# Altium footprint library JL_PCB.PCBLIB: 1129 footprints (part 42 of 72)
Each footprint in its own frame and in the unit in brackets; x right, y up, seen from the top. Pads: shape width x height; smd on the part's side, far side on the other; paste and mask are expansions set on the pad; w line width, h text height; cw(c..) or ccw(c..) is an arc to the next point about the centre after c.
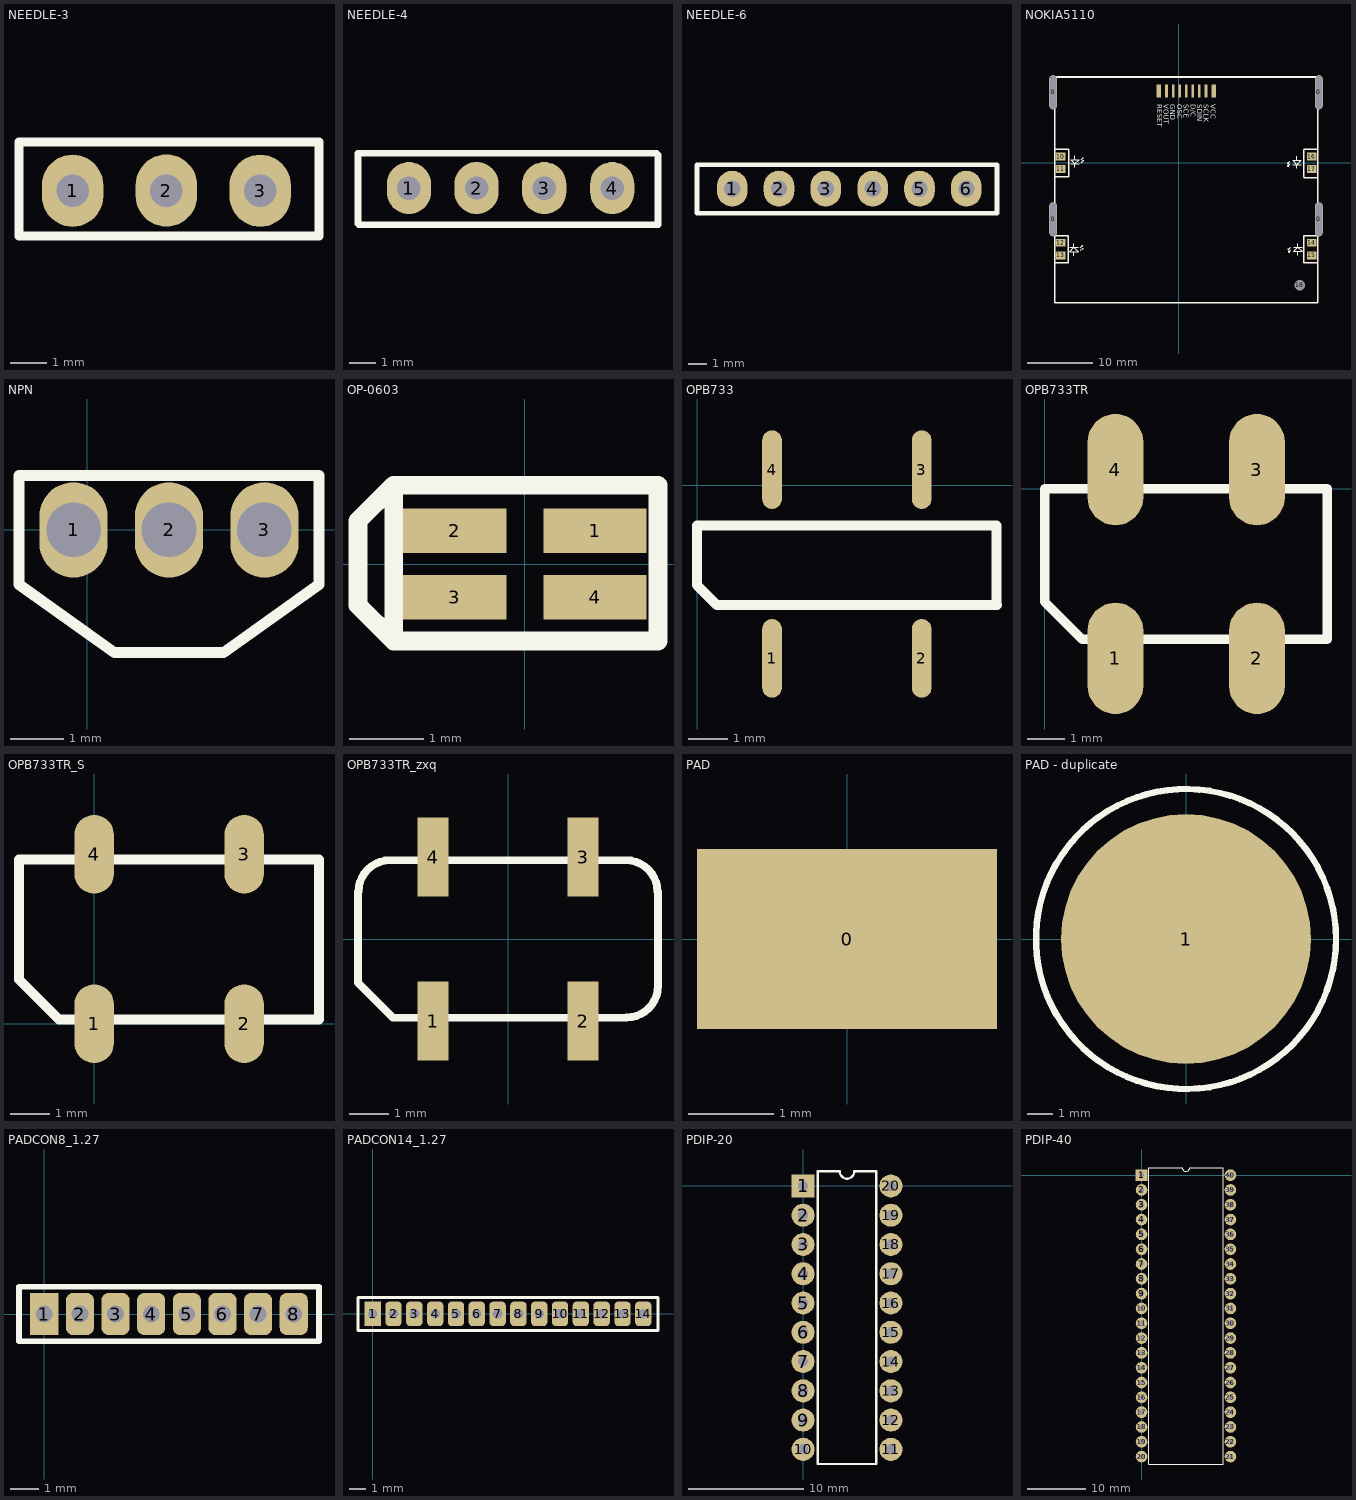
[diagram p41: the footprints below, top view; thin cyan lines are the x and y axes]

## NEEDLE-3 [mm]
pads (3):
  oval 1.7x2 hole 0.9: 1(297.583,114.754) 2(300.178,114.758) 3(302.773,114.754)
TopOverlay:
  lines w0.254: 296.1,113.5 296.1,116.1 304.4,116.1 304.4,113.5 296.1,113.5

## NEEDLE-4 [mm]
pads (4):
  oval 1.7x2 hole 0.9: 1(297.555,114.865) 2(300.15,114.869) 3(302.745,114.865) 4(305.355,114.865)
TopOverlay:
  lines w0.254: 295.6,113.5 295.6,116.2 307.056,116.2 307.111,116.144 307.111,113.462 ; 295.638,113.462 307.111,113.462 ; 307.073,113.5 307.111,113.462

## NEEDLE-6 [mm]
pads (6):
  oval 1.7x2 hole 0.9: 1(298.368,115.652) 2(300.963,115.656) 3(303.558,115.652) 4(306.168,115.652) 5(308.768,115.652) 6(311.368,115.652)
TopOverlay:
  lines w0.254: 296.413,114.287 313.068,114.287 313.068,116.987 296.413,116.987 296.413,114.287

## NOKIA5110 [mm]
pads (22):
  oval 1.2x5.2 hole 1 slot 5 at 90 deg: 0(-19.104,-8.636) 0(-19.104,10.668) 0(21.282,-8.636) 0(21.282,10.668)
  rect 0.7x2 smd: 1(5.276,10.882) 9(-3.024,10.882)
  rect 0.4x2 smd: 2(4.126,10.882) 3(3.126,10.882) 4(2.126,10.882) 5(1.126,10.882) 6(0.126,10.882) 7(-0.874,10.882) 8(-1.874,10.882)
  rect 1.5x1.2 smd: 10(-17.954,0.9) 11(-17.954,-1) 12(-17.954,-12.2) 13(-17.954,-14.1) 14(20.196,-12.2) 15(20.196,-14.1) 16(20.196,0.9) 17(20.196,-1)
  round 1.5 on Mech1 hole 1.6: 18(18.352,-18.63)
TopOverlay:
  lines w0.1: -14.948,-12.958 -14.598,-12.608 ; -14.898,-13.358 -14.548,-13.008 ; -14.848,0.396 -14.498,0.746 ; -14.798,-0.004 -14.448,0.346 ; -14.748,-12.608 -14.598,-12.608 ; -14.698,-13.008 -14.548,-13.008 ; -14.648,0.746 -14.498,0.746 ; -14.598,-12.758 -14.598,-12.608 ; -14.598,0.346 -14.448,0.346 ; -14.548,-13.158 -14.548,-13.008 ; -14.498,0.596 -14.498,0.746 ; -14.448,0.196 -14.448,0.346 ; 16.526,-0.004 16.526,-0.154 ; 16.576,-0.404 16.576,-0.554 ; 16.63,-13.112 16.63,-13.262 ; 16.676,-0.154 16.526,-0.154 ; 16.68,-13.512 16.68,-13.662 ; 16.726,-0.554 16.576,-0.554 ; 16.78,-13.262 16.63,-13.262 ; 16.83,-13.662 16.68,-13.662 ; 16.876,0.196 16.526,-0.154 ; 16.926,-0.204 16.576,-0.554 ; 16.98,-12.912 16.63,-13.262 ; 17.03,-13.312 16.68,-13.662
  lines w0.15: -16.598,-12.908 -15.298,-12.908 ; -16.448,-0.204 -15.148,-0.204 ; -15.948,-14.158 -15.948,-13.558 ; -15.948,-12.358 -15.948,-12.908 ; -15.798,-0.754 -15.798,-0.204 ; -15.798,0.446 -15.798,1.046 ; 17.276,-0.304 18.576,-0.304 ; 17.43,-12.862 18.73,-12.862 ; 17.926,-0.854 17.926,-0.304 ; 17.926,0.346 17.926,0.946 ; 18.08,-14.112 18.08,-13.512 ; 18.08,-12.312 18.08,-12.862 ; -15.948,-12.908 -15.298,-13.558 -16.598,-13.558 -15.948,-12.908 ; -15.798,-0.204 -16.448,0.446 -15.148,0.446 -15.798,-0.204 ; 17.926,-0.304 17.276,0.346 18.576,0.346 17.926,-0.304 ; 18.08,-12.862 18.73,-13.512 17.43,-13.512 18.08,-12.862
  lines w0.2: -18.874,-15.266 -16.766,-15.266 -16.766,-11.1 -18.874,-11.1 ; -18.859,2.025 -16.751,2.025 ; -18.809,-2.201 -16.7,-2.201 -16.7,1.959 ; 18.987,-2.293 21.095,-2.293 ; 18.987,-2.201 18.987,1.959 ; 18.987,2.025 21.095,2.025 ; 21.115,-15.26 19.007,-15.26 19.007,-11.1 21.146,-11.1
  lines w0.254: -18.874,-21.318 -18.874,12.982 21.126,12.982 21.126,-21.318 -18.874,-21.318
  text "VCC" at 4.826,8.89 h0.76
  text "SCLK" at 3.81,8.89 h0.76
  text "SDIN" at 2.794,8.89 h0.76
  text "D/C" at 1.778,8.89 h0.76
  text "SCE" at 0.762,8.89 h0.76
  text "OSC" at -0.254,8.89 h0.76
  text "GND" at -1.27,8.89 h0.76
  text "VOUT" at -2.286,8.89 h0.76
  text "RESET" at -3.302,8.89 h0.76

## NPN [mil]
pads (3):
  oval 50x70 hole 40: 1(-10,0) 2(60,0) 3(130,0)
TopOverlay:
  lines w8: -50,-40 -50,40 170,40 170,-40 100,-90 20,-90 -50,-40

## OP-0603 [mm]
pads (4):
  rect 1.4x0.6 smd: 1(0.95,0.45) 2(-0.95,0.45) 3(-0.95,-0.45) 4(0.95,-0.45)
TopOverlay:
  lines w0.254: -1.778,1.041 -1.778,1.067 ; -1.778,-1.041 -2.261,-0.559 -2.261,0.584 -1.778,1.067 ; -1.778,-1.041 -1.778,1.067 ; -1.778,-1.041 1.803,-1.041 1.803,1.067 -1.778,1.067
3D body "OP-0603.STEP": height 0.65, standoff 0, extent -0.864,-0.787 0.736,0.813

## OPB733 [mm]
pads (4):
  oval 0.5x2 smd: 1(1.91,-4.4) 2(5.72,-4.4) 3(5.72,0.4) 4(1.91,0.4)
TopOverlay:
  lines w0.254: 7.62,-3.032 7.62,-1.016 0,-1.016 0,-2.54 0.508,-3.048 1.016,-3.048 7.636,-3.048

## OPB733TR [mm]
pads (4):
  oval 1.5x3 smd: 1(1.91,-4.572) 2(5.72,-4.572) 3(5.72,0.508) 4(1.91,0.508)
TopOverlay:
  lines w0.254: 0,-3.048 0,0 ; 0,-3.048 1.016,-4.064 7.62,-4.064 ; 0,-3.048 0,0 ; 0,0 7.62,0 ; 0,0 7.62,0 ; 7.62,-4.064 7.62,0 ; 7.62,-4.064 7.62,0

## OPB733TR_S [mm]
pads (4):
  oval 1x2 smd: 1(0,0) 2(3.81,0) 3(3.81,4.3) 4(0,4.3)
TopOverlay:
  lines w0.254: -1.91,1.124 -1.91,4.172 ; -1.91,1.124 -0.894,0.108 5.71,0.108 ; -1.91,1.124 -1.91,4.172 ; -1.91,4.172 5.71,4.172 ; -1.91,4.172 5.71,4.172 ; 5.71,0.108 5.71,4.172 ; 5.71,0.108 5.71,4.172

## OPB733TR_zxq [mm]
pads (4):
  rect 0.8x2 smd: 1(-1.905,-2.083) 2(1.905,-2.083) 3(1.905,2.083) 4(-1.905,2.083)
TopOverlay:
  lines w0.2: -3.81,1.2 -3.81,-1.111 -2.921,-2 2.997,-2 ; -3.797,1.2 cw(c-2.997,1.2) -2.997,2 2.997,2 cw(c2.997,1.2) 3.797,1.2 ; 3.01,-1.994 ccw(c3.01,-1.194) 3.81,-1.194 ; 3.81,-1.2 3.81,1.2

## PAD [mm]
pads (1):
  rect 3.5x2.1 smd: 0(0,0)

## PAD - duplicate [mm]
pads (1):
  round 10 smd: 1(0,0)
TopOverlay:
  circle w0.254: c0,0 r6

## PADCON8_1.27 [mm]
pads (8):
  rect 1x1.5 hole 0.6: 1(0,0)
  rrect50% 1x1.5 hole 0.6: 2(1.27,0) 3(2.54,0) 4(3.81,0) 5(5.08,0) 6(6.35,0) 7(7.62,0) 8(8.89,0)
TopOverlay:
  lines w0.2: -0.9,-0.965 9.79,-0.965 9.79,0.965 -0.9,0.965 -0.9,-0.965

## PADCON14_1.27 [mm]
pads (14):
  rect 1x1.5 hole 0.6: 1(0,0)
  rrect50% 1x1.5 hole 0.6: 2(1.27,0) 3(2.54,0) 4(3.81,0) 5(5.08,0) 6(6.35,0) 7(7.62,0) 8(8.89,0) 9(10.16,0) 10(11.43,0) 11(12.7,0) 12(13.97,0) 13(15.24,0) 14(16.51,0)
TopOverlay:
  lines w0.2: -0.9,-1.016 -0.9,0.991 17.41,0.991 17.41,-1.016 -0.9,-1.016

## PDIP-20 [mm]
pads (20):
  rect 2x2 hole 0.889: 1(0,0)
  round 2 hole 0.889: 2(0,-2.54) 3(0,-5.08) 4(0,-7.62) 5(0,-10.16) 6(0,-12.7) 7(0,-15.24) 8(0,-17.78) 9(0,-20.32) 10(0,-22.86) 11(7.62,-22.86) 12(7.62,-20.32) 13(7.62,-17.78) 14(7.62,-15.24) 15(7.62,-12.7) 16(7.62,-10.16) 17(7.62,-7.62) 18(7.62,-5.08) 19(7.62,-2.54) 20(7.62,0)
TopOverlay:
  lines w0.2: 1.27,-24.13 1.27,1.27 3.175,1.27 ccw(c3.81,1.27) 4.445,1.27 6.35,1.27 6.35,-24.13 1.27,-24.13

## PDIP-40 [mm]
pads (40):
  rect 2x2 hole 0.889: 1(0,0)
  round 2 hole 0.889: 2(0,-2.54) 3(0,-5.08) 4(0,-7.62) 5(0,-10.16) 6(0,-12.7) 7(0,-15.24) 8(0,-17.78) 9(0,-20.32) 10(0,-22.86) 11(0,-25.4) 12(0,-27.94) 13(0,-30.48) 14(0,-33.02) 15(0,-35.56) 16(0,-38.1) 17(0,-40.64) 18(0,-43.18) 19(0,-45.72) 20(0,-48.26) 21(15.24,-48.26) 22(15.24,-45.72) 23(15.24,-43.18) 24(15.24,-40.64) 25(15.24,-38.1) 26(15.24,-35.56) 27(15.24,-33.02) 28(15.24,-30.48) 29(15.24,-27.94) 30(15.24,-25.4) 31(15.24,-22.86) 32(15.24,-20.32) 33(15.24,-17.78) 34(15.24,-15.24) 35(15.24,-12.7) 36(15.24,-10.16) 37(15.24,-7.62) 38(15.24,-5.08) 39(15.24,-2.54) 40(15.24,0)
TopOverlay:
  lines w0.2: 1.27,-49.53 13.97,-49.53 13.97,1.27 8.255,1.27 cw(c7.62,1.27) 6.985,1.27 1.27,1.27 1.27,-49.53